# Altium footprint library 全库.PcbLib: 967 footprints (part 29 of 61)
Each footprint in its own frame and in the unit in brackets; x right, y up, seen from the top. Pads: shape width x height; smd on the part's side, far side on the other; paste and mask are expansions set on the pad; w line width, h text height; cw(c..) or ccw(c..) is an arc to the next point about the centre after c.
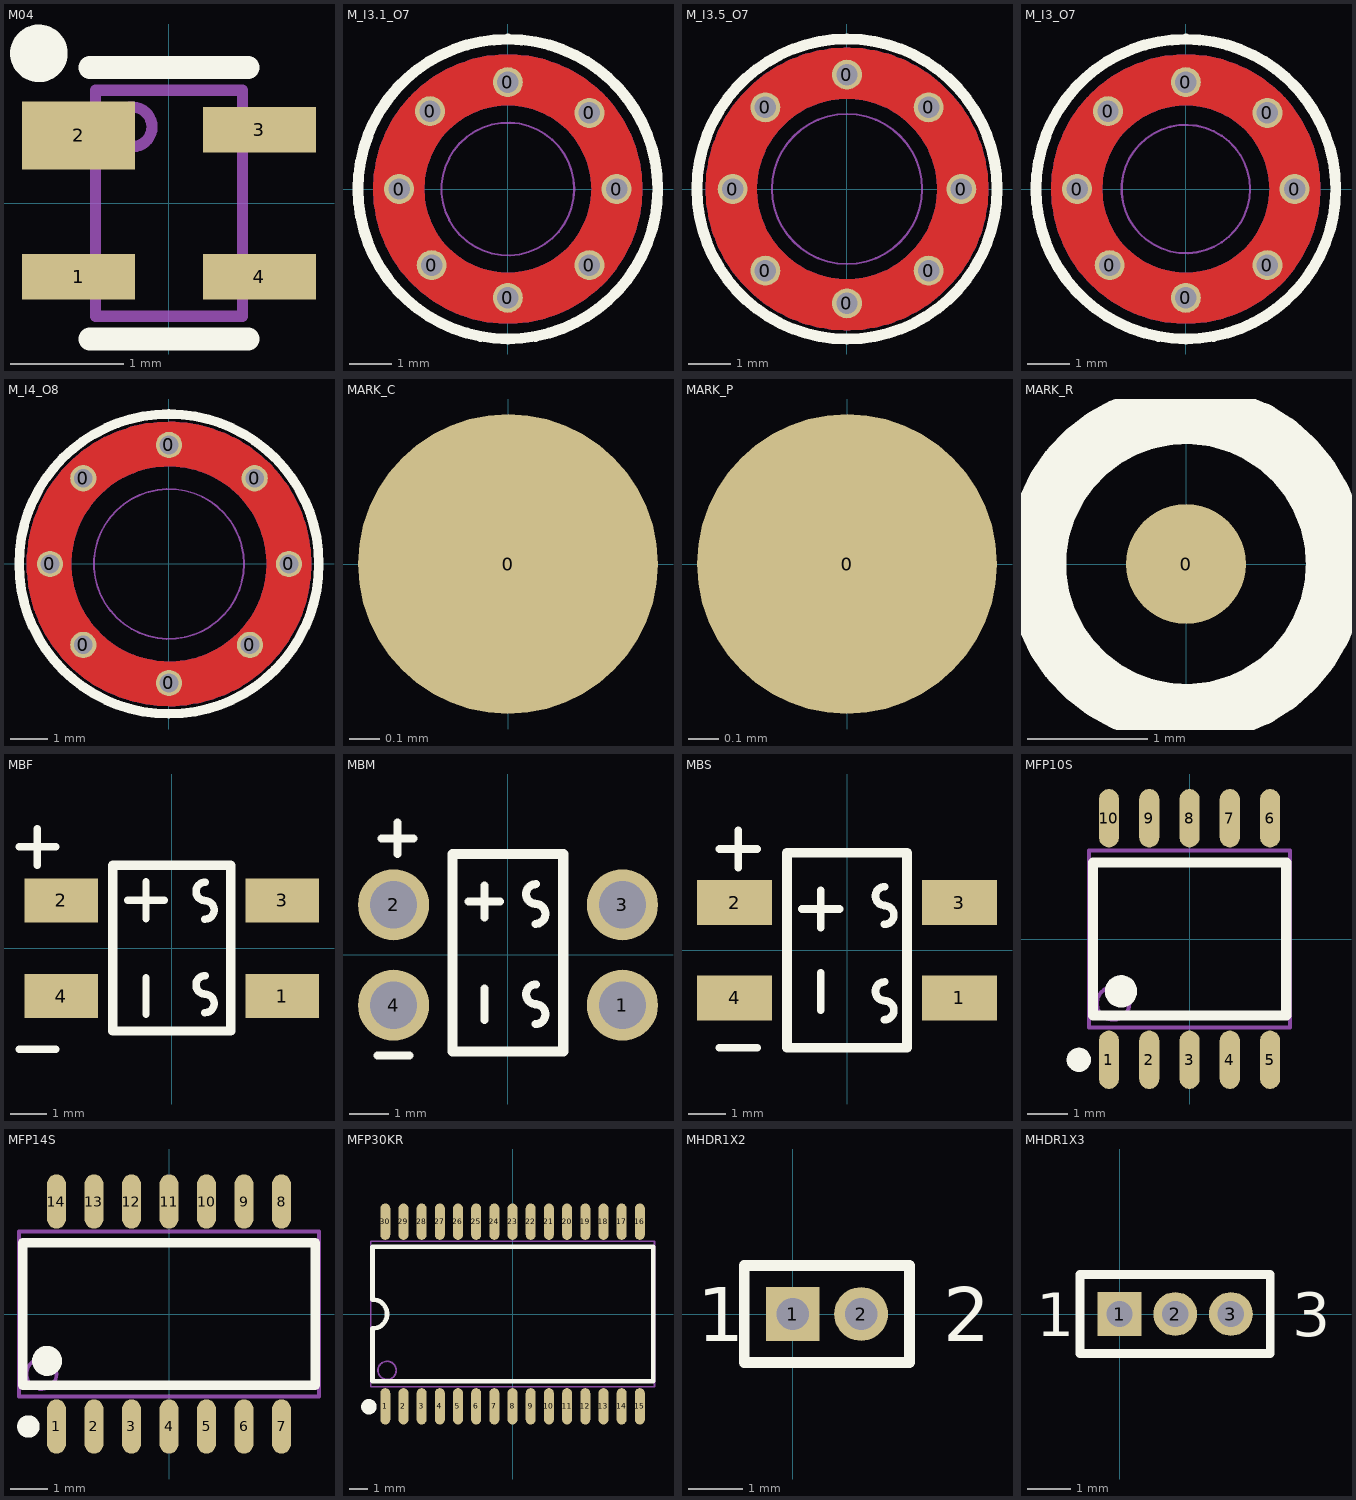
[diagram p28: the footprints below, top view; thin cyan lines are the x and y axes]

## M04 [mm]
pads (4):
  rect 1x0.4 smd: 1(-0.8,-0.65) 3(0.8,0.65) 4(0.8,-0.65)
  rect 1x0.6 smd: 2(-0.8,0.6)
Top Overlay:
  circle w0.254: c-1.15,1.325 r0.127
  lines w0.2: -0.7,-1.2 0.7,-1.2 ; -0.7,1.2 0.7,1.2
Mechanical 13:
  circle w0.1: c-0.325,0.675 r0.175
  lines w0.1: -0.65,-1 0.65,-1 0.65,1 -0.65,1 -0.65,-1

## M_I3.1_O7 [mm]
pads (8):
  round 0.7 hole 0.5: 0(-2.54,0) 0(-1.818,1.818) 0(-1.778,-1.778) 0(0,-2.54) 0(0,2.496) 0(1.905,-1.778) 0(1.905,1.778) 0(2.54,0)
Top Layer:
  circle w1.2: c0,0 r2.55
Bottom Layer:
  circle w1.2: c0,0 r2.55
Top Overlay:
  circle w0.254: c0,0 r3.5
Bottom Overlay:
  circle w0.254: c0.007,0.001 r3.5
Top Solder:
  circle w1.3: c0,0 r2.55
Bottom Solder:
  circle w1.3: c0,0 r2.55
Mechanical 1:
  circle w0.05: c0,0 r1.55

## M_I3.5_O7 [mm] "螺丝孔"
height 0.5
pads (8):
  round 0.7 hole 0.5: 0(-2.667,0) 0(-1.905,-1.905) 0(-1.905,1.905) 0(0,-2.667) 0(0,2.667) 0(1.905,-1.905) 0(1.905,1.905) 0(2.667,0)
Top Layer:
  circle w1.2: c0,0 r2.7
Bottom Layer:
  circle w1.2: c0,0 r2.7
Top Overlay:
  circle w0.254: c0,0 r3.5
Bottom Overlay:
  circle w0.254: c0,0 r3.5
Top Solder:
  circle w1.3: c0,0 r2.7
Bottom Solder:
  circle w1.3: c0,0 r2.7
Mechanical 1:
  circle w0.05: c0,0 r1.75

## M_I3_O7 [mm]
pads (8):
  round 0.7 hole 0.5: 0(-2.54,0) 0(-1.818,1.818) 0(-1.778,-1.778) 0(0,-2.54) 0(0,2.496) 0(1.905,-1.778) 0(1.905,1.778) 0(2.54,0)
Top Layer:
  circle w1.2: c0,0 r2.55
Bottom Layer:
  circle w1.2: c0,0 r2.55
Top Overlay:
  circle w0.254: c0,0 r3.5
Bottom Overlay:
  circle w0.254: c0.007,0.001 r3.5
Top Solder:
  circle w1.3: c0,0 r2.55
Bottom Solder:
  circle w1.3: c0,0 r2.55
Mechanical 1:
  circle w0.05: c0,0 r1.5

## M_I4_O8 [mm]
pads (8):
  round 0.7 hole 0.5: 0(-3.175,0) 0(-2.286,-2.159) 0(-2.286,2.286) 0(0,-3.175) 0(0,3.175) 0(2.159,-2.159) 0(2.286,2.286) 0(3.2,0)
Top Layer:
  circle w1.2: c0,0 r3.2
Bottom Layer:
  circle w1.2: c0,0 r3.2
Top Overlay:
  circle w0.254: c0,0 r4
Bottom Overlay:
  circle w0.254: c0.002,-0.003 r4
Top Solder:
  circle w1.3: c0,0 r3.2
Bottom Solder:
  circle w1.3: c0,0 r3.2
Mechanical 1:
  circle w0.05: c0,0 r2

## MARK_C [mm]
pads (1):
  round 1 smd paste+0 mask+1: 0(0,0)

## MARK_P [mm]
pads (1):
  round 1 smd mask+0: 0(0,0)

## MARK_R [mm]
pads (1):
  round 1 smd paste+0 mask+1: 0(0,0)
Top Overlay:
  circle w0.5: c0,0 r1.25

## MBF [mm]
pads (4):
  rect 2x1.2 smd: 1(3,-1.3) 2(-3,1.3) 3(3,1.3) 4(-3,-1.3)
Top Overlay:
  lines w0.203: -4.15,-2.75 -3.15,-2.75 ; -4.15,2.75 -3.15,2.75 ; -3.65,2.25 -3.65,3.25 ; -1.2,1.3 -0.2,1.3 ; -0.7,-1.8 -0.7,-0.8 ; -0.7,0.8 -0.7,1.8 ; 0.9,-1.75 ccw(c0.9,-1.5) 0.9,-1.25 ; 0.9,0.79 ccw(c0.9,1.04) 0.9,1.29 ; 0.908,-1.245 cw(c0.908,-0.995) 0.908,-0.745 ; 0.908,1.295 cw(c0.908,1.545) 0.908,1.795
  lines w0.254: -1.6,-2.25 1.6,-2.25 1.6,2.25 -1.6,2.25 -1.6,-2.25
3D body "MBF.STEP": height 1.5, standoff -0.03, extent -3.4,-2.497 3.5,2.497

## MBM [mm]
pads (4):
  round 1.8 hole 1.2: 1(2.9,-1.27) 2(-2.9,1.27) 3(2.9,1.27) 4(-2.9,-1.27)
Top Overlay:
  lines w0.203: -3.3,-2.545 -2.5,-2.545 ; -3.2,2.955 -2.4,2.955 ; -2.8,2.555 -2.8,3.355 ; -1,1.355 -0.2,1.355 ; -0.6,-1.645 -0.6,-0.845 ; -0.6,0.955 -0.6,1.755 ; 0.7,-1.75 ccw(c0.7,-1.5) 0.7,-1.25 ; 0.7,0.79 ccw(c0.7,1.04) 0.7,1.29 ; 0.708,-1.245 cw(c0.708,-0.995) 0.708,-0.745 ; 0.708,1.295 cw(c0.708,1.545) 0.708,1.795
  lines w0.254: -1.4,-2.445 1.4,-2.445 1.4,2.555 -1.4,2.555 -1.4,-2.445

## MBS [mm]
pads (4):
  rect 2x1.2 smd: 1(3,-1.27) 2(-3,1.27) 3(3,1.27) 4(-3,-1.27)
Top Overlay:
  lines w0.203: -3.4,-2.6 -2.4,-2.6 ; -3.4,2.7 -2.4,2.7 ; -2.9,2.2 -2.9,3.2 ; -1.2,1.1 -0.2,1.1 ; -0.7,-1.6 -0.7,-0.6 ; -0.7,0.6 -0.7,1.6 ; 1,-1.85 ccw(c1,-1.6) 1,-1.35 ; 1,0.69 ccw(c1,0.94) 1,1.19 ; 1.008,-1.345 cw(c1.008,-1.095) 1.008,-0.845 ; 1.008,1.195 cw(c1.008,1.445) 1.008,1.695
  lines w0.254: -1.6,-2.6 1.6,-2.6 1.6,2.6 -1.6,2.6 -1.6,-2.6

## MFP10S [mm] "MFP10S(K)"
pads (10):
  oval 0.5x1.45 smd: 1(-2,-3) 2(-1,-3) 3(0,-3) 4(1,-3) 5(2,-3) 6(2,3) 7(1,3) 8(0,3) 9(-1,3) 10(-2,3)
Top Overlay:
  circle w0.4: c-1.7,-1.3 r0.2
  circle w0.3: c-2.75,-3 r0.15
  lines w0.254: -2.4,-1.9 -2.4,1.9 2.4,1.9 2.4,-1.9 -2.4,-1.9
Mechanical 13:
  circle w0.1: c-1.9,-1.6 r0.403
  lines w0.1: -2.5,-2.2 -2.5,2.2 2.5,2.2 2.5,-2.2 -2.5,-2.2

## MFP14S [mm] "MFP14S(K)"
pads (14):
  oval 0.5x1.45 smd: 1(-3,-3) 2(-2,-3) 3(-1,-3) 4(0,-3) 5(1,-3) 6(2,-3) 7(3,-3) 8(3,3) 9(2,3) 10(1,3) 11(0,3) 12(-1,3) 13(-2,3) 14(-3,3)
Top Overlay:
  circle w0.4: c-3.25,-1.25 r0.2
  circle w0.3: c-3.75,-3 r0.15
  lines w0.254: -3.9,-1.9 -3.9,1.9 3.9,1.9 3.9,-1.9 -3.9,-1.9
Mechanical 13:
  circle w0.1: c-3.4,-1.6 r0.4
  lines w0.1: -4,-2.2 4,-2.2 4,2.2 -4,2.2 -4,-2.2

## MFP30KR [mm] "THB6128"
pads (30):
  oval 0.55x2 smd: 1(-7,-5.08) 2(-6,-5.08) 3(-5,-5.08) 4(-4,-5.08) 5(-3,-5.08) 6(-2,-5.08) 7(-1,-5.08) 8(0,-5.08) 9(1,-5.08) 10(2,-5.08) 11(3,-5.08) 12(4,-5.08) 13(5,-5.08) 14(6,-5.08) 15(7,-5.08) 16(7,5.08) 17(6,5.08) 18(5,5.08) 19(4,5.08) 20(3,5.08) 21(2,5.08) 22(1,5.08) 23(0,5.08) 24(-1,5.08) 25(-2,5.08) 26(-3,5.08) 27(-4,5.08) 28(-5,5.08) 29(-6,5.08) 30(-7,5.08)
Top Overlay:
  circle w0.45: c-7.9,-5.1 r0.2
  lines w0.254: -7.7,-3.7 -7.7,-0.8 ccw(c-7.7,0) -7.7,0.8 -7.7,3.7 7.732,3.7 7.732,-3.7 -7.7,-3.7
Mechanical 13:
  circle w0.1: c-6.9,-3.1 r0.5
  lines w0.1: -7.8,-4 7.8,-4 7.8,4 -7.8,4 -7.8,-4

## MHDR1X2 [mm]
pads (2):
  rect 1x1 hole 0.6: 1(0,0)
  round 1 hole 0.6: 2(1.27,0)
Top Overlay:
  lines w0.2: -0.9,-0.9 -0.9,0.9 2.17,0.9 2.17,-0.9 -0.9,-0.9
  text "1" at -1.778,-0.508 h1
  text "2" at 2.794,-0.508 h1

## MHDR1X3 [mm]
pads (3):
  rect 1x1 hole 0.6: 1(0,0)
  round 1 hole 0.6: 2(1.27,0) 3(2.54,0)
Top Overlay:
  lines w0.2: -0.9,-0.9 3.44,-0.9 3.44,0.9 -0.9,0.9 -0.9,-0.9
  text "3" at 3.937,-0.508 h1
  text "1" at -1.905,-0.508 h1